# Altium footprint library SwagePCB.PcbLib: 117 footprints (part 6 of 8)
Each footprint in its own frame and in the unit in brackets; x right, y up, seen from the top. Pads: shape width x height; smd on the part's side, far side on the other; paste and mask are expansions set on the pad; w line width, h text height; cw(c..) or ccw(c..) is an arc to the next point about the centre after c.
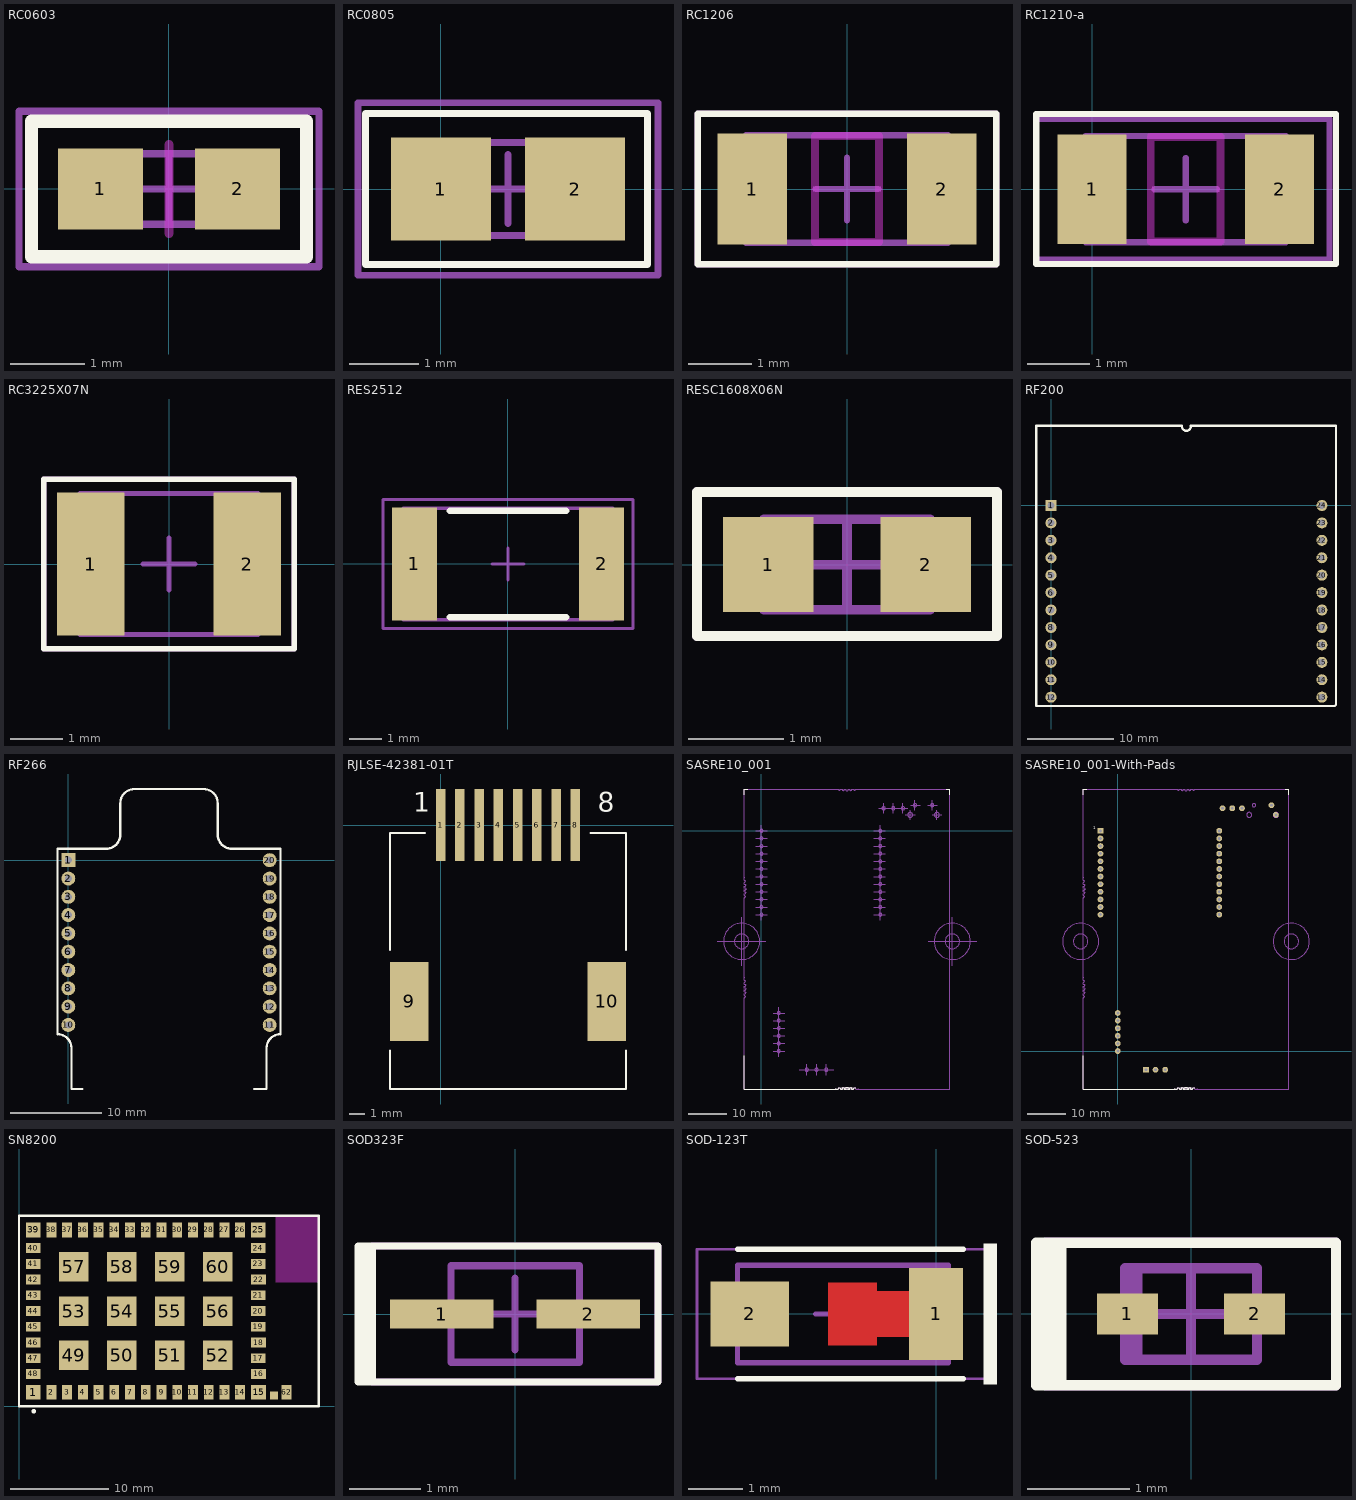
[diagram p5: the footprints below, top view; thin cyan lines are the x and y axes]

## RC0603 [mm] "Resistor, Capacitor, 0603"
height 0.55
pads (2):
  rect 1.15x1.1 smd: 1(-0.925,0) 2(0.925,0)
Top Layer keep-out:
  lines w0.127: 0,-0.6 0,0.6
Top Overlay:
  lines w0.178: -1.854,-0.914 -1.854,0.914 1.854,0.914 1.854,-0.914 -1.854,-0.914
Mechanical 13:
  lines w0.1: -0.875,-0.475 -0.875,0.475 0.875,0.475 0.875,-0.475 -0.875,-0.475
Mechanical 15:
  lines w0.1: -0.475,0 0.475,0 ; 0,-0.475 0,0.475 ; -2.025,-1.05 -2.025,1.05 2.025,1.05 2.025,-1.05 -2.025,-1.05
3D body: height 0.55, standoff 0, extent -0.875,-0.475 0.875,0.475

## RC0805 [mm]
height 0.5
pads (2):
  rect 1.45x1.5 smd: 1(0,0) 2(1.95,0)
Top Overlay:
  lines w0.102: -1.092,-1.092 2.997,-1.092 2.997,1.092 -1.092,1.092 -1.092,-1.092
Mechanical 13:
  lines w0.1: -0.075,-0.675 -0.075,0.675 2.025,0.675 2.025,-0.675 -0.075,-0.675
Mechanical 15:
  lines w0.1: 0.475,0 1.475,0 ; 0.975,-0.5 0.975,0.5 ; -1.2,-1.25 -1.2,1.25 3.15,1.25 3.15,-1.25 -1.2,-1.25
3D body: height 0.5, standoff 0, extent -0.075,-0.675 2.025,0.675

## RC1206 [mm] "1206 Footprint"
height 0.65
pads (2):
  rect 1.1x1.75 smd: 1(-1.5,0) 2(1.5,0)
Top Layer keep-out:
  lines w0.127: -0.508,-0.838 0.508,-0.838 0.508,0.838 -0.508,0.838 -0.508,-0.838
Top Overlay:
  lines w0.1: -2.362,-1.194 -2.362,1.194 2.362,1.194 2.362,-1.194 -2.362,-1.194
Mechanical 13:
  lines w0.1: -1.6,-0.85 1.6,-0.85 1.6,0.85 -1.6,0.85 -1.6,-0.85
Mechanical 15:
  lines w0.1: -0.5,0 0.5,0 ; 0,-0.5 0,0.5 ; -2.362,-1.194 2.362,-1.194 2.362,1.194 -2.362,1.194 -2.362,-1.194
3D body: height 0.65, standoff 0, extent -1.6,-0.85 1.6,0.85

## RC1210-a [mm] "1210 Footprint"
height 0.65
pads (2):
  rect 1.1x1.75 smd: 1(0,0) 2(3,0)
Top Layer keep-out:
  lines w0.127: 0.94,-0.838 2.057,-0.838 2.057,0.838 0.94,0.838 0.94,-0.838
Top Overlay:
  lines w0.1: -0.893,-1.197 3.903,-1.197 3.903,1.203 -0.893,1.203 -0.893,-1.197
Mechanical 13:
  lines w0.1: -0.1,-0.85 -0.1,0.85 3.1,0.85 3.1,-0.85 -0.1,-0.85
Mechanical 15:
  lines w0.1: 1,0 2,0 ; 1.5,-0.5 1.5,0.5 ; -0.897,-1.125 -0.897,1.125 3.8,1.125 3.8,-1.125 -0.897,-1.125
3D body: height 0.65, standoff 0, extent -0.1,-0.85 3.1,0.85

## RC3225X07N [mm] "Chip Resistor, 2-Leads, Body 3.2x2.5mm, IPC Medium Density"
height 0.7
pads (2):
  rect 1.3x2.75 smd: 1(-1.5,0) 2(1.5,0)
Top Overlay:
  lines w0.1: -2.4,-1.625 2.4,-1.625 2.4,1.625 -2.4,1.625 -2.4,-1.625
Mechanical 13:
  lines w0.1: -1.7,-1.35 -1.7,1.35 1.7,1.35 1.7,-1.35 -1.7,-1.35
Mechanical 15:
  lines w0.1: -0.5,0 0.5,0 ; 0,-0.5 0,0.5 ; -2.4,-1.625 -2.4,1.625 2.4,1.625 2.4,-1.625 -2.4,-1.625
3D body: height 0.7, standoff 0, extent -1.7,-1.35 1.7,1.35

## RES2512 [mm]
height 0.7
pads (2):
  rect 1.4x3.5 smd: 1(-2.9,0) 2(2.9,0)
Top Overlay:
  lines w0.2: -1.8,-1.65 1.8,-1.65 ; -1.8,1.65 1.8,1.65
Mechanical 13:
  lines w0.1: -3.25,-1.725 3.25,-1.725 3.25,1.725 -3.25,1.725 -3.25,-1.725
Mechanical 15:
  lines w0.1: -0.5,0 0.5,0 ; 0,-0.5 0,0.5 ; -3.875,-2 3.875,-2 3.875,2 -3.875,2 -3.875,-2
3D body: height 0.7, standoff 0, extent -3.25,-1.725 3.25,1.725

## RESC1608X06N [mm] "Chip Resistor, 2-Leads, Body 1.6x0.8mm, IPC Medium Density"
height 0.55
pads (2):
  rect 0.95x1 smd: 1(-0.825,0) 2(0.825,0)
Top Overlay:
  lines w0.1: -1.575,-0.75 -1.575,0.762 1.575,0.762 1.575,-0.75 -1.575,-0.75
Mechanical 13:
  lines w0.1: -0.875,-0.475 0.875,-0.475 0.875,0.475 -0.875,0.475 -0.875,-0.475
Mechanical 15:
  lines w0.1: -0.475,0 0.475,0 ; 0,-0.475 0,0.475 ; -1.575,-0.75 1.575,-0.75 1.575,0.762 -1.575,0.762 -1.575,-0.75
3D body: height 0.55, standoff 0, extent -0.875,-0.475 0.875,0.475

## RF200 [mil]
pads (24):
  rect 50x50 hole 30: 1(0,0)
  round 50 hole 30: 2(0,-79) 3(0,-158) 4(0,-237) 5(0,-316) 6(0,-395) 7(0,-474) 8(0,-553) 9(0,-632) 10(0,-711) 11(0,-790) 12(0,-869) 13(1228,-869) 14(1228,-790) 15(1228,-711) 16(1228,-632) 17(1228,-553) 18(1228,-474) 19(1228,-395) 20(1228,-316) 21(1228,-237) 22(1228,-158) 23(1228,-79) 24(1228,0)
Top Overlay:
  lines w10: -68,-908.5 1287.5,-908.5 1292,-904 1292,361.5 633.75,361.5 ; -67,-908.5 -67,-671.5 -67,-494.38 -67,-405.81 -67,-228.69 -67,-140.12 -67,360 ; -67,359 -67,361.5 ; -66,361.5 594.25,361.5 ; 594,358 ccw(c613.75,358) 633.5,358

## RF266 [mil] "Synapse RF266 SNAP Transceiver"
height 275.59
pads (20):
  rect 60x60 hole 30: 1(0,0)
  round 60 hole 30: 2(0,-78.74) 3(0,-157.48) 4(0,-236.22) 5(0,-314.96) 6(0,-393.7) 7(0,-472.44) 8(0,-551.18) 9(0,-629.92) 10(0,-708.66) 11(866.14,-708.66) 12(866.14,-629.92) 13(866.14,-551.18) 14(866.14,-472.44) 15(866.14,-393.7) 16(866.14,-314.96) 17(866.14,-236.22) 18(866.14,-157.48) 19(866.14,-78.74) 20(866.14,0)
Top Overlay:
  lines w10: 13.65,-808.53 ccw(c-46.85,-808.53) -46.85,-748.03 -46.85,49.21 162.8,49.21 ccw(c162.8,109.71) 223.3,109.71 223.56,245.6 cw(c284.06,245.6) 284.06,306.1 580.71,306.3 ; 13.78,-808.53 13.78,-984.25 60,-984.25 ; 582.09,306.1 cw(c582.09,245.6) 642.59,245.6 642.85,109.71 ccw(c703.35,109.71) 703.35,49.21 912.99,49.21 912.99,-748.03 ccw(c912.99,-808.53) 852.49,-808.53 ; 800,-984.25 852.36,-984.25 852.36,-808.53
3D body: height 275.59, standoff 157.48, extent -50,-985 915,305

## RJLSE-42381-01T [mm] "RJ45 Connector, Right Angle, SMD"
height 11.73
pads (10):
  rect 0.64x4.75 smd: 1(0,0) 2(1.27,0) 3(2.54,0) 4(3.81,0) 5(5.08,0) 6(6.35,0) 7(7.62,0) 8(8.89,0)
  rect 2.54x5.207 smd: 9(-2.057,-11.633) 10(10.947,-11.633)
Top Overlay:
  lines w0.127: -3.327,-14.866 -3.327,-17.412 12.217,-17.412 12.217,-14.866 ; -3.327,-8.256 -3.327,-0.521 -1.041,-0.521 ; 9.881,-0.521 12.217,-0.521 ; 12.227,-8.256 12.227,-0.53
  text "1" at -1.797,0.888 h1.27
  text "8" at 10.377,0.878 h1.27
3D body: height 11.73, standoff 0, extent -3.329,-17.412 12.221,-0.523

## SASRE10_001 [mm] "E10 Gateway Module"
Top Overlay:
  lines w0.127: -4.55,-59.091 -4.55,-67.771 19.384,-67.771 19.45,-67.762 19.516,-67.771 20.144,-67.771 20.167,-67.654 20.234,-67.555 20.333,-67.488 20.45,-67.465 20.567,-67.488 20.666,-67.555 20.733,-67.654 20.756,-67.771 21.164,-67.771 21.144,-67.671 21.167,-67.554 21.234,-67.455 21.333,-67.388 21.45,-67.365 21.567,-67.388 21.666,-67.455 21.733,-67.554 21.756,-67.671 21.736,-67.771 22.223,-67.771 22.167,-67.688 22.144,-67.571 22.167,-67.454 22.234,-67.355 22.333,-67.288 22.45,-67.265 22.567,-67.288 22.666,-67.355 22.733,-67.454 22.756,-67.571 22.733,-67.688 22.677,-67.771 23.164,-67.771 23.144,-67.671 23.167,-67.554 23.234,-67.455 23.333,-67.388 23.45,-67.365 23.567,-67.388 23.666,-67.455 23.733,-67.554 23.756,-67.671 23.736,-67.771 24.144,-67.771 24.167,-67.654 24.234,-67.555 24.333,-67.488 24.45,-67.465 24.567,-67.488 24.666,-67.555 ; -4.55,9.489 -4.55,10.979 -3.578,10.979 ; 48.492,10.979 49.45,10.979 49.45,9.489
Mechanical 3:
  circle w0.127: c50.1,-29.021 r4.75
  circle w0.127: c-5.2,-29.021 r4.75
  circle w0.127: c-5.2,-29.021 r1.905
  circle w0.127: c50.1,-29.021 r1.905
  lines w0.102: -11.55,-29.021 1.15,-29.021 ; -5.2,-35.371 -5.2,-22.671 ; 43.75,-29.021 56.45,-29.021 ; 50.1,-35.371 50.1,-22.671
Mechanical 5:
  drawing of 322 lines, arcs and shapes, not listed
  text "1" at -1.927,0.345 h0.76
Mechanical 11:
  circle w0.127: c39.04,4.179 r0.65
  circle w0.127: c44.79,6.719 r0.43
  circle w0.127: c46.04,4.179 r0.65
  circle w0.127: c40.29,6.719 r0.43
Mechanical 12:
  circle w0.127: c32.053,5.919 r0.44
  circle w0.127: c34.593,5.919 r0.44
  circle w0.127: c37.133,5.919 r0.44
3D body "SASRE10_001.step": height 22.86, standoff 2.86, extent -4.541,-71.264 49.459,23.437

## SASRE10_001-With-Pads [mil] "E10 Gateway Module"
pads (38):
  rect 60x60 hole 30: 1(-179.13,2276.42) 31(289.79,-192.63)
  round 60 hole 30: 2(-179.13,2197.68) 3(-179.13,2118.94) 4(-179.13,2040.2) 5(-179.13,1961.46) 6(-179.13,1882.72) 7(-179.13,1803.98) 8(-179.13,1725.24) 9(-179.13,1646.5) 10(-179.13,1567.76) 11(-179.13,1489.02) 12(-179.13,1410.28) 13(1048.74,1410.28) 14(1048.74,1489.02) 15(1048.74,1567.76) 16(1048.74,1646.5) 17(1048.74,1725.24) 18(1048.74,1803.98) 19(1048.74,1882.72) 20(1048.74,1961.46) 21(1048.74,2040.2) 22(1048.74,2118.94) 23(1048.74,2197.68) 24(1048.74,2276.42) 25(0,393.67) 26(0,314.96) 27(0,236.22) 28(0,157.48) 29(0,78.71) 30(0,0) 32(389.79,-192.63) 33(489.79,-192.63) 34(1082.81,2509.44) 35(1182.81,2509.44) 36(1282.81,2509.44) 38(1587.1,2540.93) 40(1633.48,2440.93)
Top Overlay:
  lines w5: -358.26,-50 -358.26,-391.73 584.04,-391.73 586.62,-391.39 589.2,-391.73 613.95,-391.73 614.86,-387.12 617.47,-383.22 621.38,-380.61 625.99,-379.69 630.6,-380.61 634.5,-383.22 637.11,-387.12 638.03,-391.73 654.1,-391.73 653.32,-387.8 654.23,-383.19 656.84,-379.28 660.75,-376.67 665.36,-375.75 669.97,-376.67 673.87,-379.28 676.48,-383.19 677.4,-387.8 676.62,-391.73 695.78,-391.73 693.6,-388.47 692.69,-383.86 693.6,-379.25 696.21,-375.34 700.12,-372.73 704.73,-371.82 709.34,-372.73 713.24,-375.34 715.85,-379.25 716.77,-383.86 715.85,-388.47 713.67,-391.73 732.84,-391.73 732.06,-387.8 732.97,-383.19 735.58,-379.28 739.49,-376.67 744.1,-375.75 748.71,-376.67 752.61,-379.28 755.22,-383.19 756.14,-387.8 755.36,-391.73 771.43,-391.73 772.34,-387.12 774.95,-383.22 778.86,-380.61 783.47,-379.69 788.08,-380.61 791.98,-383.22 ; -358.26,2650 -358.26,2708.66 -320,2708.66 ; 1730,2708.66 1767.72,2708.66 1767.72,2650
  text "1" at -254.92,2290.35 h30
Mechanical 3:
  circle w5: c1793.31,1133.86 r187.01
  circle w5: c-383.85,1133.86 r187.01
Mechanical 5:
  drawing of 240 lines, arcs and shapes, not listed
  text "1" at -205.09,2290 h30
Mechanical 6:
  circle w5: c-179.13,2040.2 r15.75
  circle w5: c-179.13,2118.94 r15.75
  circle w5: c-179.13,2197.68 r15.75
  circle w5: c-179.13,2276.42 r15.75
  circle w5: c-179.13,1410.28 r15.75
  circle w5: c-179.13,1489.02 r15.75
  circle w5: c-179.13,1567.76 r15.75
  circle w5: c-179.13,1646.5 r15.75
  circle w5: c-179.13,1725.24 r15.75
  circle w5: c-179.13,1803.98 r15.75
  circle w5: c-179.13,1882.72 r15.75
  circle w5: c-179.13,1961.46 r15.75
Mechanical 7:
  circle w5: c1048.74,2040.2 r15.75
  circle w5: c1048.74,2118.94 r15.75
  circle w5: c1048.74,2197.68 r15.75
  circle w5: c1048.74,2276.42 r15.75
  circle w5: c1048.74,1410.28 r15.75
  circle w5: c1048.74,1489.02 r15.75
  circle w5: c1048.74,1567.76 r15.75
  circle w5: c1048.74,1646.5 r15.75
  circle w5: c1048.74,1725.24 r15.75
  circle w5: c1048.74,1803.98 r15.75
  circle w5: c1048.74,1882.72 r15.75
  circle w5: c1048.74,1961.46 r15.75
Mechanical 8:
  circle w5: c0,0 r15.75
  circle w5: c0,78.74 r15.75
  circle w5: c0,157.48 r15.75
  circle w5: c0,236.22 r15.75
  circle w5: c0,314.96 r15.75
  circle w5: c0,393.7 r15.75
Mechanical 9:
  circle w5: c289.77,-192.63 r17.32
  circle w5: c389.77,-192.63 r17.32
  circle w5: c489.77,-192.63 r17.32
Mechanical 11:
  circle w5: c1357.88,2440.94 r25.59
  circle w5: c1584.26,2540.94 r16.93
  circle w5: c1633.47,2440.94 r25.59
  circle w5: c1407.09,2540.94 r16.93
Mechanical 12:
  circle w5: c1082.8,2509.44 r17.32
  circle w5: c1182.8,2509.44 r17.32
  circle w5: c1282.8,2509.44 r17.32
Mechanical 13:
  circle w5: c1793.31,1133.86 r75
  circle w5: c-383.85,1133.86 r75
3D body "SASRE10_001.step": height 900.04, standoff 112.6, extent -357.9,-529.27 1768.09,3199.13

## SN8200 [mm] "Murata, WiFi Module, SN8200"
height 2.8
pads (62):
  rect 1.5x1.5 smd: 1(1.45,1.45) 15(24.38,1.45) 25(24.35,17.95) 39(1.45,17.95)
  rect 1x1.5 smd: 2(3.3,1.45) 3(4.9,1.45) 4(6.5,1.45) 5(8.1,1.45) 6(9.7,1.45) 7(11.3,1.45) 8(12.9,1.45) 9(14.5,1.45) 10(16.1,1.45) 11(17.7,1.45) 12(19.3,1.45) 13(20.9,1.45) 14(22.5,1.45) 26(22.5,17.95) 27(20.9,17.95) 28(19.3,17.95) 29(17.7,17.95) 30(16.1,17.95) 31(14.5,17.95) 32(12.9,17.95) 33(11.3,17.95) 34(9.7,17.95) 35(8.1,17.95) 36(6.5,17.95) 37(4.9,17.95) 38(3.3,17.95) 62(27.23,1.45)
  rect 1.5x1 smd: 16(24.38,3.3) 17(24.35,4.9) 18(24.38,6.5) 19(24.35,8.1) 20(24.35,9.7) 21(24.35,11.3) 22(24.38,12.9) 23(24.35,14.5) 24(24.35,16.1) 40(1.45,16.1) 41(1.45,14.5) 42(1.45,12.9) 43(1.45,11.3) 44(1.45,9.7) 45(1.45,8.1) 46(1.45,6.5) 47(1.45,4.9) 48(1.45,3.3)
  rect 3x3 smd: 49(5.58,5.2) 50(10.46,5.2) 51(15.34,5.2) 52(20.22,5.2) 53(5.58,9.7) 54(10.46,9.7) 55(15.34,9.7) 56(20.22,9.7) 57(5.58,14.2) 58(10.46,14.2) 59(15.34,14.2) 60(20.22,14.2)
  rect 0.8x0.8 smd: 61(25.93,1.1)
Top Overlay:
  circle w0.254: c1.5,-0.5 r0.1
  lines w0.254: 0,0 0,19.4 30.5,19.4 30.5,0 0,0
Keep-Out Layer:
  rectangle: 26.12,12.584 30.526,19.341
3D body: height 2.8, standoff 0.1, extent 0,0 30.5,19.4

## SOD323F [mm] "SOD323F, 2-Leads, Body 1.4x1.8mm (max), Pitch 0.65mm, IPC Medium Density"
height 0.75
pads (2):
  rect 1.45x0.4 smd: 1(-1.025,0) 2(1.025,0)
Top Overlay:
  lines w0.1: -2.1,-0.95 -2.1,0.95 ; -2,-0.95 -2.2,-0.95 -2.2,0.95 -2,0.95 ; -2,-0.95 2,-0.95 2,0.95 -2,0.95 ; -2,-0.95 -2,0.95
Mechanical 13:
  lines w0.1: -0.9,-0.675 -0.9,0.675 0.9,0.675 0.9,-0.675 -0.9,-0.675
Mechanical 15:
  lines w0.1: -0.5,0 0.5,0 ; 0,-0.5 0,0.5 ; -2,-0.95 -2,0.95 2,0.95 2,-0.95 -2,-0.95
3D body: height 0.75, standoff 0.05, extent -0.9,-0.675 0.9,0.675

## SOD-123T [mm] "Molded Diode, 2-Leads, Body 3.70x1.60mm, IPC Medium Density"
height 1.7
pads (2):
  rect 1x1.7 smd: 1(0,0)
  rect 1.45x1.2 smd: 2(-3.45,0)
Top Layer:
  region: -0.5,0 -2,0 -2,-0.575 -1.1,-0.575 -1.1,-0.425 -0.5,-0.425
  region: -0.5,0 -2,0 -2,0.575 -1.1,0.575 -1.1,0.425 -0.5,0.425
Top Overlay:
  rectangle: 0.875,-1.3 1.125,1.3
  lines w0.102: -3.675,-1.2 0.5,-1.2 ; -3.675,1.2 0.5,1.2
Top Paste:
  region: -0.5,0.425 -1.1,0.425 -1.1,0.5 -1.1,0.575 -2,0.575 -2,0.571 -2,-0.575 -1.1,-0.575 -1.1,-0.573 -1.1,-0.427 -0.498,-0.427
Top Solder:
  region: -0.602,0.527 -0.999,0.527 -0.999,0.677 -0.999,0.678 -2.102,0.679 -2.101,0.677 -2.102,-0.677 -0.999,-0.677 -0.998,-0.529 -0.601,-0.529
Mechanical 13:
  rectangle: -0.3,-0.9 0.225,0.9
  lines w0.1: -3.675,-0.9 0.225,-0.9 0.225,0.9 -3.675,0.9 -3.675,-0.9
Mechanical 15:
  lines w0.05: -4.425,-1.2 0.975,-1.2 0.975,1.2 -4.425,1.2 -4.425,-1.2
  lines w0.1: -2.225,0 -1.225,0 ; -1.725,-0.5 -1.725,0.5
3D body: height 1.7, standoff 0, extent -3.675,-0.9 0.225,0.9

## SOD-523 [mm] "Molded Diode, 2-Leads, Body 1.2x0.8mm, IPC Medium Density"
height 0.7
pads (2):
  rect 0.6x0.4 smd: 1(-0.625,0) 2(0.625,0)
Top Overlay:
  lines w0.1: -1.45,-0.7 -1.45,0.7 ; -1.349,-0.7 -1.349,0.7 ; -1.273,-0.7 -1.273,0.7 ; -1.524,-0.7 1.425,-0.7 1.425,0.7 -1.524,0.7 -1.524,-0.7
Mechanical 13:
  rectangle: -0.65,-0.45 -0.475,0.45
  lines w0.1: -0.65,-0.45 -0.65,0.45 0.65,0.45 0.65,-0.45 -0.65,-0.45
Mechanical 15:
  lines w0.1: -0.45,0 0.45,0 ; 0,-0.45 0,0.45 ; -1.425,-0.7 -1.425,0.7 1.425,0.7 1.425,-0.7 -1.425,-0.7
3D body: height 0.7, standoff 0, extent -0.65,-0.45 0.65,0.45